# Altium footprint library KNR_Kurs.PcbLib: 250 footprints (part 9 of 16)
Each footprint in its own frame and in the unit in brackets; x right, y up, seen from the top. Pads: shape width x height; smd on the part's side, far side on the other; paste and mask are expansions set on the pad; w line width, h text height; cw(c..) or ccw(c..) is an arc to the next point about the centre after c.
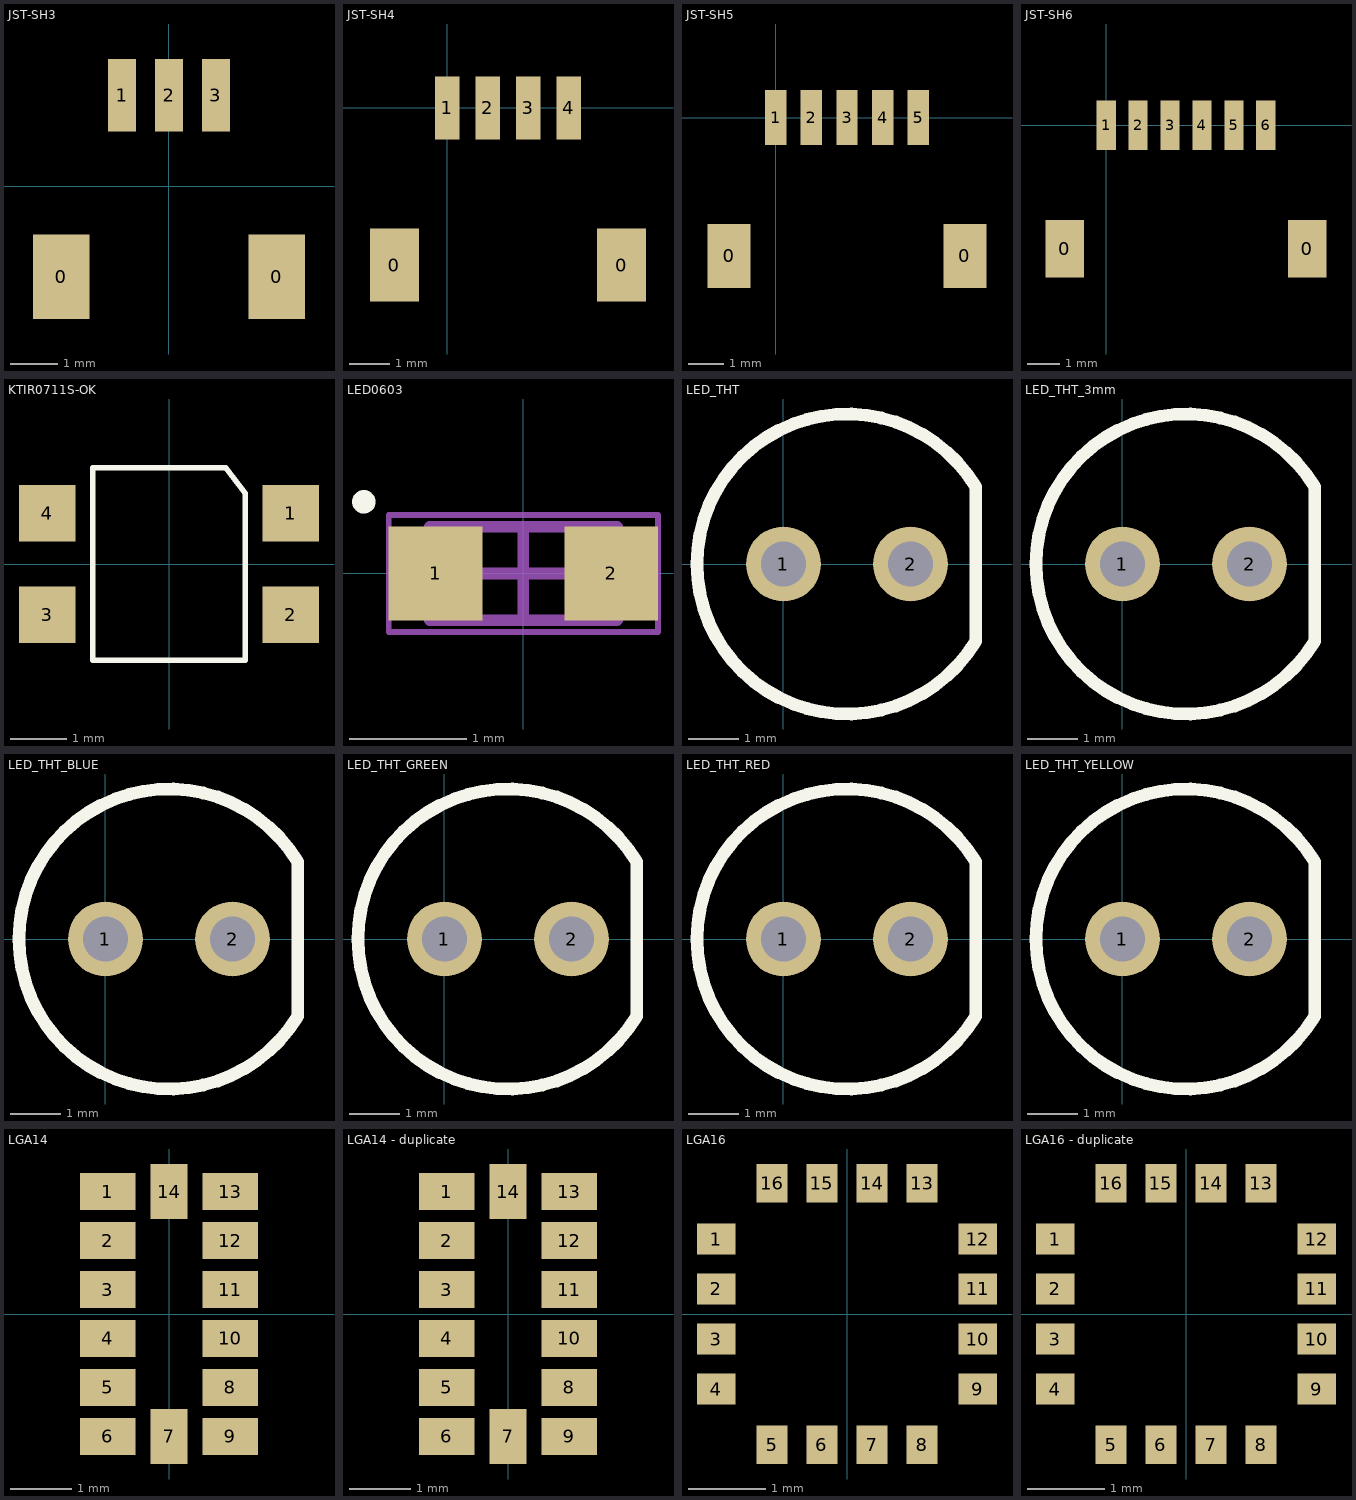
[diagram p8: the footprints below, top view; thin cyan lines are the x and y axes]

## JST-SH3 [mm] "3-Pin JST-SH SMD"
pads (5):
  rect 1.2x1.8 smd: 0(-2.3,-1.937) 0(2.3,-1.937)
  rect 0.6x1.55 smd: 1(-1,1.938) 2(0,1.938) 3(1,1.938)
3D body "jst bm03.stp": height 2.9, standoff 0, extent -2.475,-2.687 2.525,1.563

## JST-SH4 [mm] "4-Pin JST-SH SMD"
pads (6):
  rect 1.2x1.8 smd: 0(-1.3,-3.875) 0(4.3,-3.875)
  rect 0.6x1.55 smd: 1(0,0) 2(1,0) 3(2,0) 4(3,0)
3D body "jst bm04.stp": height 2.9, standoff 0, extent -1.475,-4.675 4.525,-0.425

## JST-SH5 [mm] "5-Pin JST-SH SMD"
pads (7):
  rect 1.2x1.8 smd: 0(-1.3,-3.875) 0(5.3,-3.875)
  rect 0.6x1.55 smd: 1(0,0) 2(1,0) 3(2,0) 4(3,0) 5(4,0)
3D body "User Library-JST - SM05B-SRSS-TB (SH SERIES - 1_0mm PITCH WIRE-TO-BOARD, SMT, RA).step": height 2.9, standoff 0, extent -1.5,-4.65 5.5,0.3

## JST-SH6 [mm] "6-Pin JST-SH SMD"
pads (8):
  rect 1.2x1.8 smd: 0(-1.3,-3.875) 0(6.3,-3.875)
  rect 0.6x1.55 smd: 1(0,0) 2(1,0) 3(2,0) 4(3,0) 5(4,0) 6(5,0)
3D body "User Library-JST - SM06B-SRSS-TB (SH SERIES - 1_0mm PITCH WIRE-TO-BOARD, SMT, RA).step": height 2.9, standoff 0, extent -1.5,-4.625 6.5,0.325

## KTIR0711S-OK [mm]
height 1.5
pads (4):
  rect 1x1 smd mask+0.05: 1(2.15,0.9) 2(2.15,-0.9) 3(-2.15,-0.9) 4(-2.15,0.9)
Top Overlay:
  lines w0.1: -1.35,-1.7 -1.35,1.7 1,1.7 1.35,1.25 1.35,-1.7 -1.35,-1.7
3D body "ktir0711s.step": height 1.5, standoff 0, extent -2.25,-1.7 2.25,1.7

## LED0603 [mm] "Chip Diode, 2-Leads, Body 1,60x0,80mm, IPC High Density"
height 0.45
pads (2):
  rect 0.8x0.8 smd: 1(-0.75,0) 2(0.75,0)
Top Overlay:
  circle w0.1: c-1.362,0.612 r0.05
Mechanical 13:
  lines w0.1: -0.8,-0.4 0.8,-0.4 0.8,0.4 -0.8,0.4 -0.8,-0.4
Mechanical 15:
  lines w0.05: -1.15,-0.5 1.15,-0.5 1.15,0.5 -1.15,0.5 -1.15,-0.5
  lines w0.1: -0.4,0 0.4,0 ; 0,-0.4 0,0.4
3D body: height 0.45, standoff 0, extent 0.4,-0.4 0.8,0.4
3D body: height 0.45, standoff 0, extent -0.8,-0.4 -0.4,0.4
3D body "User Library-LED 0603.step": height 0.7, standoff 0, extent -0.8,-0.4 0.801,0.4

## LED_THT [mm] "Bended version of LED\Phototransistor"
pads (2):
  round 1.5 hole 0.9: 1(0,0) 2(2.54,0)
Top Overlay:
  lines w0.254: 3.842,1.505 3.842,-1.543 cw(c1.27,0) 3.842,1.543
3D body "LED_THT_transparent.stp": height 8.97, standoff -3, extent -1.63,-2.874 3.77,2.926

## LED_THT_3mm [mm]
pads (2):
  round 1.5 hole 0.9: 1(0,0) 2(2.54,0)
Top Overlay:
  lines w0.254: 3.842,-1.543 cw(c1.27,0) 3.842,1.543 3.842,-1.543
3D body "LED3mm.stp": height 5.46, standoff -1, extent -0.254,-1.499 2.885,1.499

## LED_THT_BLUE [mm]
pads (2):
  round 1.5 hole 0.9: 1(0,0) 2(2.54,0)
Top Overlay:
  lines w0.254: 3.842,1.505 3.842,-1.543 cw(c1.27,0) 3.842,1.543
3D body "LED_THT_BLUE.stp": height 8.97, standoff -3, extent -1.63,-2.874 3.77,2.926

## LED_THT_GREEN [mm]
pads (2):
  round 1.5 hole 0.9: 1(0,0) 2(2.54,0)
Top Overlay:
  lines w0.254: 3.842,1.505 3.842,-1.543 cw(c1.27,0) 3.842,1.543
3D body "LED_THT_GREEN.stp": height 8.97, standoff -3, extent -1.63,-2.874 3.77,2.926

## LED_THT_RED [mm]
pads (2):
  round 1.5 hole 0.9: 1(0,0) 2(2.54,0)
Top Overlay:
  lines w0.254: 3.842,1.505 3.842,-1.543 cw(c1.27,0) 3.842,1.543
3D body "LED_THT_RED.stp": height 8.97, standoff -3, extent -1.63,-2.874 3.77,2.926

## LED_THT_YELLOW [mm]
pads (2):
  round 1.5 hole 0.9: 1(0,0) 2(2.54,0)
Top Overlay:
  lines w0.254: 3.842,1.505 3.842,-1.543 cw(c1.27,0) 3.842,1.543
3D body "LED_THT_YELLOW.stp": height 8.97, standoff -3, extent -1.63,-2.874 3.77,2.926

## LGA14 [mm]
height 1
pads (14):
  rect 0.9x0.6 smd mask+0.05: 1(-1,2) 2(-1,1.2) 3(-1,0.4) 4(-1,-0.4) 5(-1,-1.2) 6(-1,-2) 8(1,-1.2) 9(1,-2) 10(1,-0.4) 11(1,0.4) 12(1,1.2) 13(1,2)
  rect 0.6x0.9 smd mask+0.05: 7(0,-2) 14(0,2)
3D body: height 1, standoff 0.22, extent -1.5,-2.5 1.5,2.5

## LGA14 - duplicate [mm]
height 1
pads (14):
  rect 0.9x0.6 smd mask+0.05: 1(-1,2) 2(-1,1.2) 3(-1,0.4) 4(-1,-0.4) 5(-1,-1.2) 6(-1,-2) 8(1,-1.2) 9(1,-2) 10(1,-0.4) 11(1,0.4) 12(1,1.2) 13(1,2)
  rect 0.6x0.9 smd mask+0.05: 7(0,-2) 14(0,2)
3D body: height 1, standoff 0.22, extent -1.5,-2.5 1.5,2.5

## LGA16 [mm]
height 1
pads (16):
  rect 0.5x0.4 smd mask+0.05: 1(-1.7,0.975) 2(-1.7,0.325) 3(-1.7,-0.325) 4(-1.7,-0.975) 9(1.7,-0.975) 10(1.7,-0.325) 11(1.7,0.325) 12(1.7,0.975)
  rect 0.4x0.5 smd mask+0.05: 5(-0.975,-1.7) 6(-0.325,-1.7) 7(0.325,-1.7) 8(0.975,-1.7) 13(0.975,1.7) 14(0.325,1.7) 15(-0.325,1.7) 16(-0.975,1.7)
3D body: height 1, standoff 0.22, extent -2,-2 2,2

## LGA16 - duplicate [mm]
height 1
pads (16):
  rect 0.5x0.4 smd mask+0.05: 1(-1.7,0.975) 2(-1.7,0.325) 3(-1.7,-0.325) 4(-1.7,-0.975) 9(1.7,-0.975) 10(1.7,-0.325) 11(1.7,0.325) 12(1.7,0.975)
  rect 0.4x0.5 smd mask+0.05: 5(-0.975,-1.7) 6(-0.325,-1.7) 7(0.325,-1.7) 8(0.975,-1.7) 13(0.975,1.7) 14(0.325,1.7) 15(-0.325,1.7) 16(-0.975,1.7)
3D body: height 1, standoff 0.22, extent -2,-2 2,2